# Altium footprint library Hydra_Ref_pcb.PcbLib: 353 footprints (part 14 of 23)
Each footprint in its own frame and in the unit in brackets; x right, y up, seen from the top. Pads: shape width x height; smd on the part's side, far side on the other; paste and mask are expansions set on the pad; w line width, h text height; cw(c..) or ccw(c..) is an arc to the next point about the centre after c.
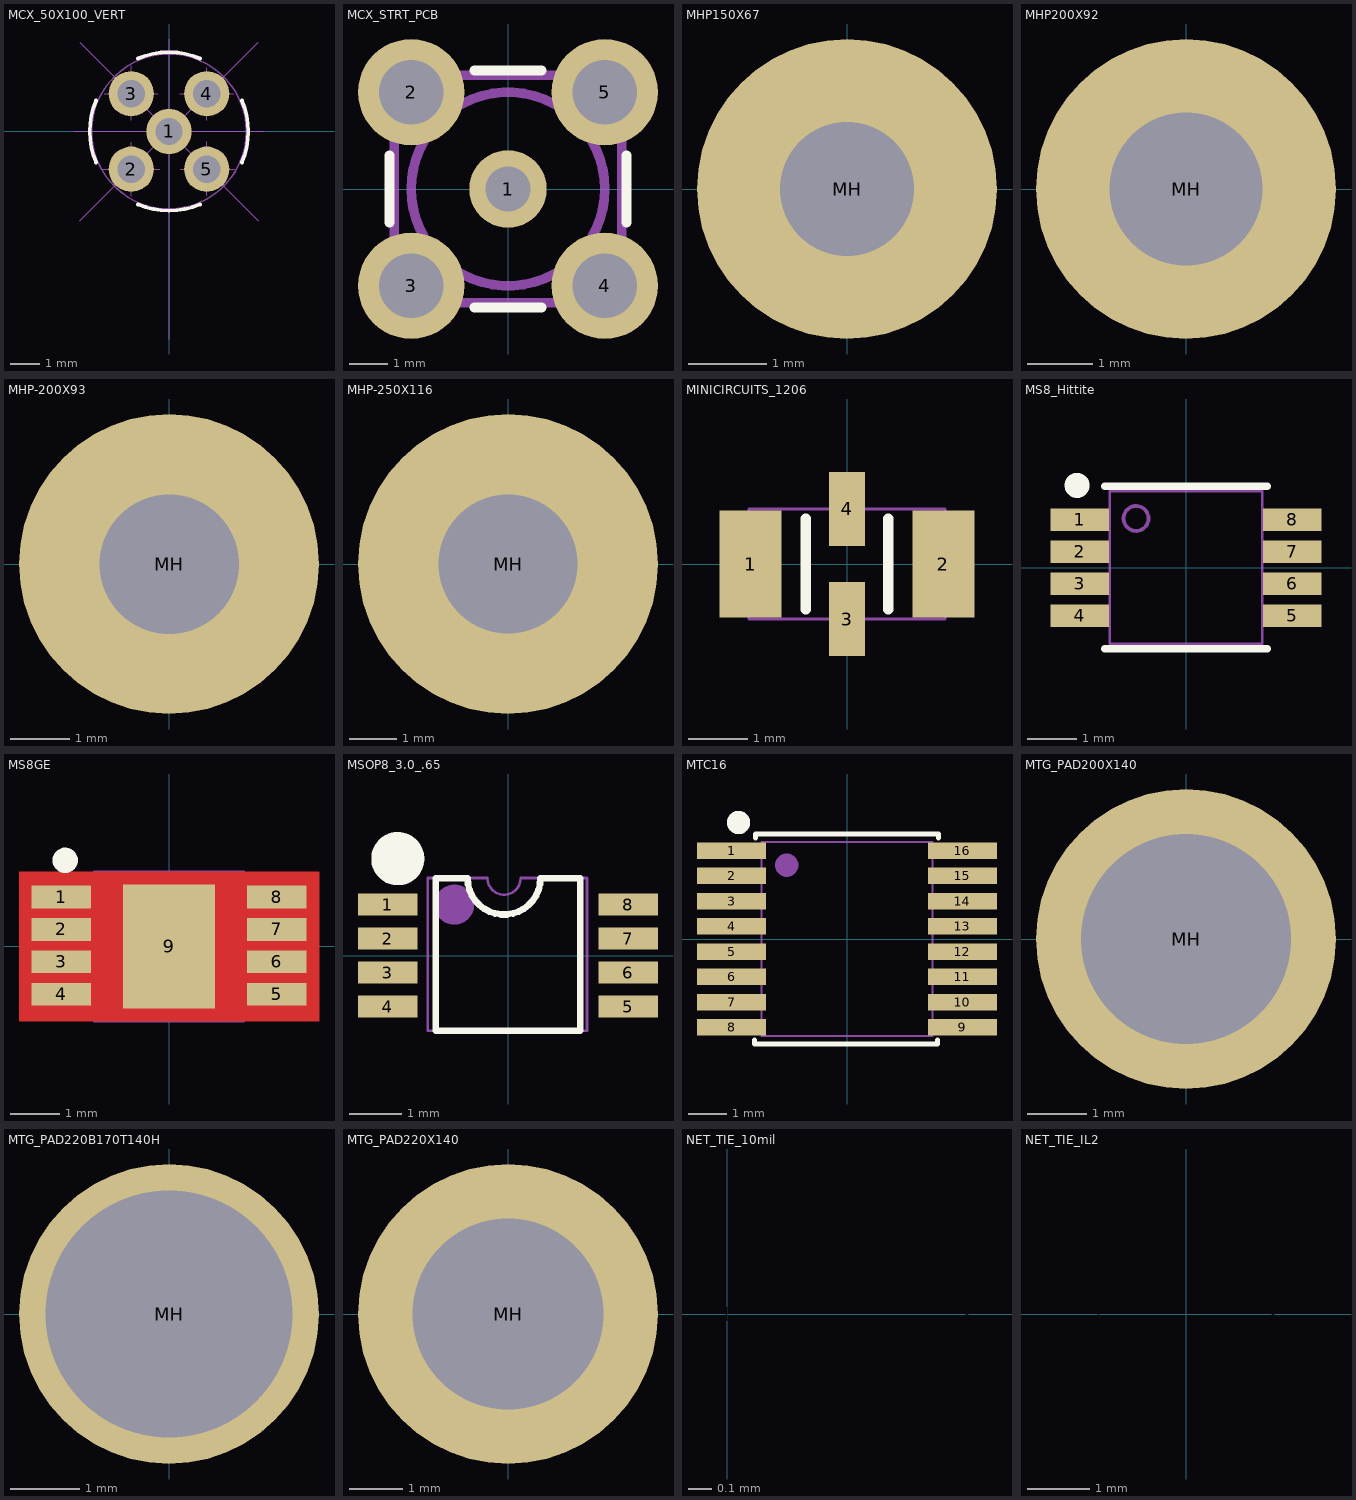
[diagram p13: the footprints below, top view; thin cyan lines are the x and y axes]

## MCX_50X100_VERT [mil] "old part"
pads (5):
  round 60 hole 36: 1(0,0) 2(-50,-50) 3(-50,50) 4(50,50) 5(50,-50)
Top Overlay:
  lines w5: -96.65,-41.03 cw(c0,0) -96.65,41.03 ; -41.03,-96.65 ccw(c0,0) 41.03,-96.65 ; -41.03,96.65 cw(c0,0) 41.03,96.65 ; 96.65,-41.03 ccw(c0,0) 96.65,41.03
9 Top Assy:
  circle w2: c0,0 r102.5
  text ".Designator" at -88.5,-25 h46
11 Top Glue:
  circle w1: c0,0 r102.5
22 Part Dimentions & Info:
  lines w1: -126,0 126,0 ; -118,-118 118,118 ; -118,118 118,-118 ; -88.5,-50 -12,-50 ; -86,50 -15,50 ; -50,-86 -50,-14 ; -50,15 -50,87 ; 0,-275 0,0 0,122.5 ; 14.5,50 86,50 ; 15,-50 87,-50 ; 50,-85.5 50,-13.5 ; 50,15 50,84.5

## MCX_STRT_PCB [mil] "MCX F PC MOUNT CONNECTOR"
height 236
pads (5):
  round 80 hole 46: 1(0,0)
  round 110 hole 67: 2(-100,100) 3(-100,-100) 4(100,-100) 5(100,100)
Top Overlay:
  lines w10: -122.5,-35 -122.5,35 ; -35,-122.5 35,-122.5 ; -35,122.5 35,122.5 ; 122.5,-35 122.5,35
9 Top Assy:
  circle w10: c0,0 r100
  lines w10: -117.5,-117.5 117.5,-117.5 117.5,117.5 -117.5,117.5 -117.5,-117.5
  text ".Designator" at -65,-44 h50

## MHP150X67 [mil]
height 0.1
pads (1):
  round 150 / inner round 115 / far side round 150 hole 67: MH(0,0)

## MHP200X92 [mil]
height 70
pads (1):
  round 180 / inner round 125 / far side round 180 hole 92 mask+20: MH(0,0)

## MHP-200X93 [mil] "Mounting PT Hole .093\" Pad .200\""
pads (1):
  round 200 hole 93: MH(0,0)
9 Top Assy:
  circle w2: c0,0 r60.03

## MHP-250X116 [mil] "Mounting PT Hole .116\" Pad .250\" (outer layers) and .140\" (inner layer)"
height 0.1
pads (1):
  round 250 / inner round 140 / far side round 250 hole 116: MH(0,0)

## MINICIRCUITS_1206 [mil] "old part"
pads (4):
  rect 41x71 smd: 1(-64,0) 2(64,0)
  rect 24x49 smd: 3(0,-36.5) 4(0,36.5)
Top Layer:
  lines w24: 0,-32.5 0,-25 0,-24.5 ; 0,24.5 0,25 0,31.5
Top Overlay:
  lines w7: -27.5,-30 -27.5,30 ; 27.5,-30 27.5,30
9 Top Assy:
  lines w2: -65,-36.5 -65,36.5 65,36.5 65,-36.5 -65,-36.5
  text ".Designator" at -55,-16 h32
3D body: height 0.1, standoff 0, extent -64.98,-36.48 64.98,36.48

## MS8_Hittite [mil] "SOP, 8-Leads, Body 3.1x3.1mm, Pitch 0.65mm, IPC High Density"
height 43
pads (8):
  rect 47x18 smd mask+2: 1(-85,38.4) 2(-85,12.8) 3(-85,-12.8) 4(-85,-38.4) 5(85,-38.4) 6(85,-12.8) 7(85,12.8) 8(85,38.4)
Top Overlay:
  circle w10: c-87.13,65.69 r5
  lines w5.98: -64.96,-65 64.96,-65 ; -64.96,65 64.96,65
Top Solder:
  pour cut-out: -120,-65 120,-65 120,65 -120,65
9 Top Assy:
  circle w3: c-39.95,39.28 r10
  lines w1: -75,-44.3 -75,-32.3 ; -75,-18.7 -75,-6.7 ; -75,6.9 -75,18.9 ; -75,32.5 -75,44.5 ; -61,-44.46 -100,-44.46 -100,-32.3 -61,-32.3 ; -61,-18.86 -100,-18.86 -100,-6.7 -61,-6.7 ; -61,6.74 -100,6.74 -100,18.9 -61,18.9 ; -61,32.34 -100,32.34 -100,44.5 -61,44.5 ; 61,-44.46 100,-44.46 100,-32.3 61,-32.3 ; 61,-18.86 100,-18.86 100,-6.7 61,-6.7 ; 61,6.74 100,6.74 100,18.9 61,18.9 ; 61,32.34 100,32.34 100,44.5 61,44.5 ; 75,-44.3 75,-32.3 ; 75,-18.7 75,-6.7 ; 75,6.9 75,18.9 ; 75,32.5 75,44.5
  lines w2.01: -61,-61 -61,61 61,61 61,-61 -61,-61
  text ".Designator" at 6.18,-40.3 h22
3D body: height 43, standoff 0, extent -61,-61 61,61

## MS8GE [mil] "RoHS Mold Compound 192X118X43(mil)"
height 43.31
pads (9):
  rect 47x18 smd mask+1.97: 1(-85,39) 2(-85,13.4) 3(-85,-12.2) 4(-85,-37.8) 5(85,-37.8) 6(85,-12.2) 7(85,13.4) 8(85,39)
  rect 73x98 smd mask+1.97: 9(0,0)
Top Layer:
  pour cut-out: -118.5,-59 118.5,-59 118.5,59 -118.5,59
Top Overlay:
  circle w10: c-82,68 r5
Top Solder:
  pour cut-out: -118.5,-59 118.5,-59 118.5,59 -118.5,59
9 Top Assy:
  lines w2: -59,-59 59,-59 59,59 -59,59 -59,-59
  text ".Designator" at -49,-38 h30
3D body: height 43, standoff 0.39, extent -59,-59 59,59

## MSOP8_3.0_.65 [mil] "old part"
pads (8):
  rect 45x16.5 smd: 1(-90.5,38.4) 2(-90.5,12.8) 3(-90.5,-12.8) 4(-90.5,-38.4) 5(90.5,-38.4) 6(90.5,-12.8) 7(90.5,12.8) 8(90.5,38.4)
Top Overlay:
  circle w20: c-83,73 r10
  lines w5: -54.5,-56.6 54.5,-56.6 54.5,58.4 24.5,58.4 cw(c-3,58.4) -30.5,58.4 -54.5,58.4 -54.5,-56.6
Top Paste:
  region: 68,46.65 68,30.15 113,30.15 113,46.65
  region: -113,46.65 -113,30.15 -68,30.15 -68,46.65
  region: 68,-30.15 68,-46.65 113,-46.65 113,-30.15
  region: 68,-4.55 68,-21.05 113,-21.05 113,-4.55
  region: 68,21.05 68,4.55 113,4.55 113,21.05
  region: -113,-30.15 -113,-46.65 -68,-46.65 -68,-30.15
  region: -113,-4.55 -113,-21.05 -68,-21.05 -68,-4.55
  region: -113,21.05 -113,4.55 -68,4.55 -68,21.05
Top Solder:
  region: 68,46.65 68,30.15 113,30.15 113,46.65
  region: -113,46.65 -113,30.15 -68,30.15 -68,46.65
  region: 68,-30.15 68,-46.65 113,-46.65 113,-30.15
  region: 68,-4.55 68,-21.05 113,-21.05 113,-4.55
  region: 68,21.05 68,4.55 113,4.55 113,21.05
  region: -113,-30.15 -113,-46.65 -68,-46.65 -68,-30.15
  region: -113,-4.55 -113,-21.05 -68,-21.05 -68,-4.55
  region: -113,21.05 -113,4.55 -68,4.55 -68,21.05
9 Top Assy:
  circle w20: c-40.5,38.4 r5
  lines w2: -60.5,-56.6 59.5,-56.6 59.5,58.4 9.5,58.4 cw(c-3,58.4) -15.5,58.4 -60.5,58.4 -60.5,-56.6
  text ".Designator" at -50.4,-42 h28
3D body: height 0.1, standoff 0, extent -126,-75.6 126,75.6

## MTC16 [mm] "16-Lead Thin Shrink Small Outline Package, L(5mm)XW(4.4mm)XH(1.1mm)"
height 1.1
pads (16):
  rect 1.78x0.42 smd mask+0.051: 1(-2.97,2.275) 2(-2.97,1.625) 3(-2.97,0.975) 4(-2.97,0.325) 5(-2.97,-0.325) 6(-2.97,-0.975) 7(-2.97,-1.625) 8(-2.97,-2.275) 9(2.97,-2.275) 10(2.97,-1.625) 11(2.97,-0.975) 12(2.97,-0.325) 13(2.97,0.325) 14(2.97,0.975) 15(2.97,1.625) 16(2.97,2.275)
Top Overlay:
  circle w0.3: c-2.792,2.997 r0.15
  lines w0.127: -2.375,-2.599 -2.375,-2.7 2.325,-2.7 2.325,-2.6 ; -2.35,2.599 -2.35,2.7 2.35,2.7 2.35,2.6
9 Top Assy:
  circle w0.3: c-1.55,1.9 r0.15
  lines w0.051: -2.667,-2.391 -2.667,-2.162 ; -2.667,-1.741 -2.667,-1.512 ; -2.667,-1.091 -2.667,-0.862 ; -2.667,-0.441 -2.667,-0.212 ; -2.667,0.209 -2.667,0.438 ; -2.667,0.859 -2.667,1.088 ; -2.667,1.509 -2.667,1.738 ; -2.667,2.159 -2.667,2.388 ; -2.2,-2.366 -2.2,-2.391 -3.2,-2.391 -3.2,-2.162 -2.2,-2.162 ; -2.2,-1.716 -2.2,-1.741 -3.2,-1.741 -3.2,-1.512 -2.2,-1.512 ; -2.2,-1.066 -2.2,-1.091 -3.2,-1.091 -3.2,-0.862 -2.2,-0.862 ; -2.2,-0.416 -2.2,-0.441 -3.2,-0.441 -3.2,-0.212 -2.2,-0.212 ; -2.2,0.234 -2.2,0.209 -3.2,0.209 -3.2,0.438 -2.2,0.438 ; -2.2,0.884 -2.2,0.859 -3.2,0.859 -3.2,1.088 -2.2,1.088 ; -2.2,1.534 -2.2,1.509 -3.2,1.509 -3.2,1.738 -2.2,1.738 ; -2.2,2.184 -2.2,2.159 -3.2,2.159 -3.2,2.388 -2.2,2.388 ; 2.2,-2.366 2.2,-2.391 3.2,-2.391 3.2,-2.162 2.2,-2.162 ; 2.2,-1.716 2.2,-1.741 3.2,-1.741 3.2,-1.512 2.2,-1.512 ; 2.2,-1.066 2.2,-1.091 3.2,-1.091 3.2,-0.862 2.2,-0.862 ; 2.2,-0.416 2.2,-0.441 3.2,-0.441 3.2,-0.212 2.2,-0.212 ; 2.2,0.234 2.2,0.209 3.2,0.209 3.2,0.438 2.2,0.438 ; 2.2,0.884 2.2,0.859 3.2,0.859 3.2,1.088 2.2,1.088 ; 2.2,1.534 2.2,1.509 3.2,1.509 3.2,1.738 2.2,1.738 ; 2.2,2.184 2.2,2.159 3.2,2.159 3.2,2.388 2.2,2.388 ; 2.667,-2.391 2.667,-2.162 ; 2.667,-1.741 2.667,-1.512 ; 2.667,-1.091 2.667,-0.862 ; 2.667,-0.441 2.667,-0.212 ; 2.667,0.209 2.667,0.438 ; 2.667,0.859 2.667,1.088 ; 2.667,1.509 2.667,1.738 ; 2.667,2.159 2.667,2.388 ; -2.2,-2.5 2.2,-2.5 2.2,2.5 -2.2,2.5 -2.2,-2.5
  text ".Designator" at -1.143,-0.254 h0.64
3D body: height 1.1, standoff 0.01, extent -2.2,-2.5 2.2,2.5

## MTG_PAD200X140 [mil]
height 0.1
pads (1):
  round 200 hole 140: MH(0,0)

## MTG_PAD220B170T140H [mil] "Pad 220 on the bottom and 170 on the top side"
height 0.1
pads (1):
  round 170 / inner round 170 / far side round 220 hole 140: MH(0,0)

## MTG_PAD220X140 [mil]
height 0.1
pads (1):
  round 220 hole 140: MH(0,0)

## NET_TIE_10mil [mil]
pads (2):
  round 10 on Mid4: 1(0,0) 2(40,0)
MidLayer4:
  lines w10: 0,0 40,0
9 Top Assy:
  text ".Designator" at -5,-21 h10

## NET_TIE_IL2 [mil]
height 10
pads (2):
  rect 50x80 on Mid3: 1(-55,0) 2(55,0)
MidLayer2:
  lines w80: -35.43,0 37.4,0
9 Top Assy:
  text ".Designator" at -17.72,-3.94 h10
3D body: height 24, standoff 0.39, extent -78.74,-39.37 80.71,39.37